# Altium footprint library WR-TBL_Rising Cage Clamp.PcbLib: 435 footprints (part 15 of 28)
Each footprint in its own frame and in the unit in brackets; x right, y up, seen from the top. Pads: shape width x height; smd on the part's side, far side on the other; paste and mask are expansions set on the pad; w line width, h text height; cw(c..) or ccw(c..) is an arc to the next point about the centre after c.
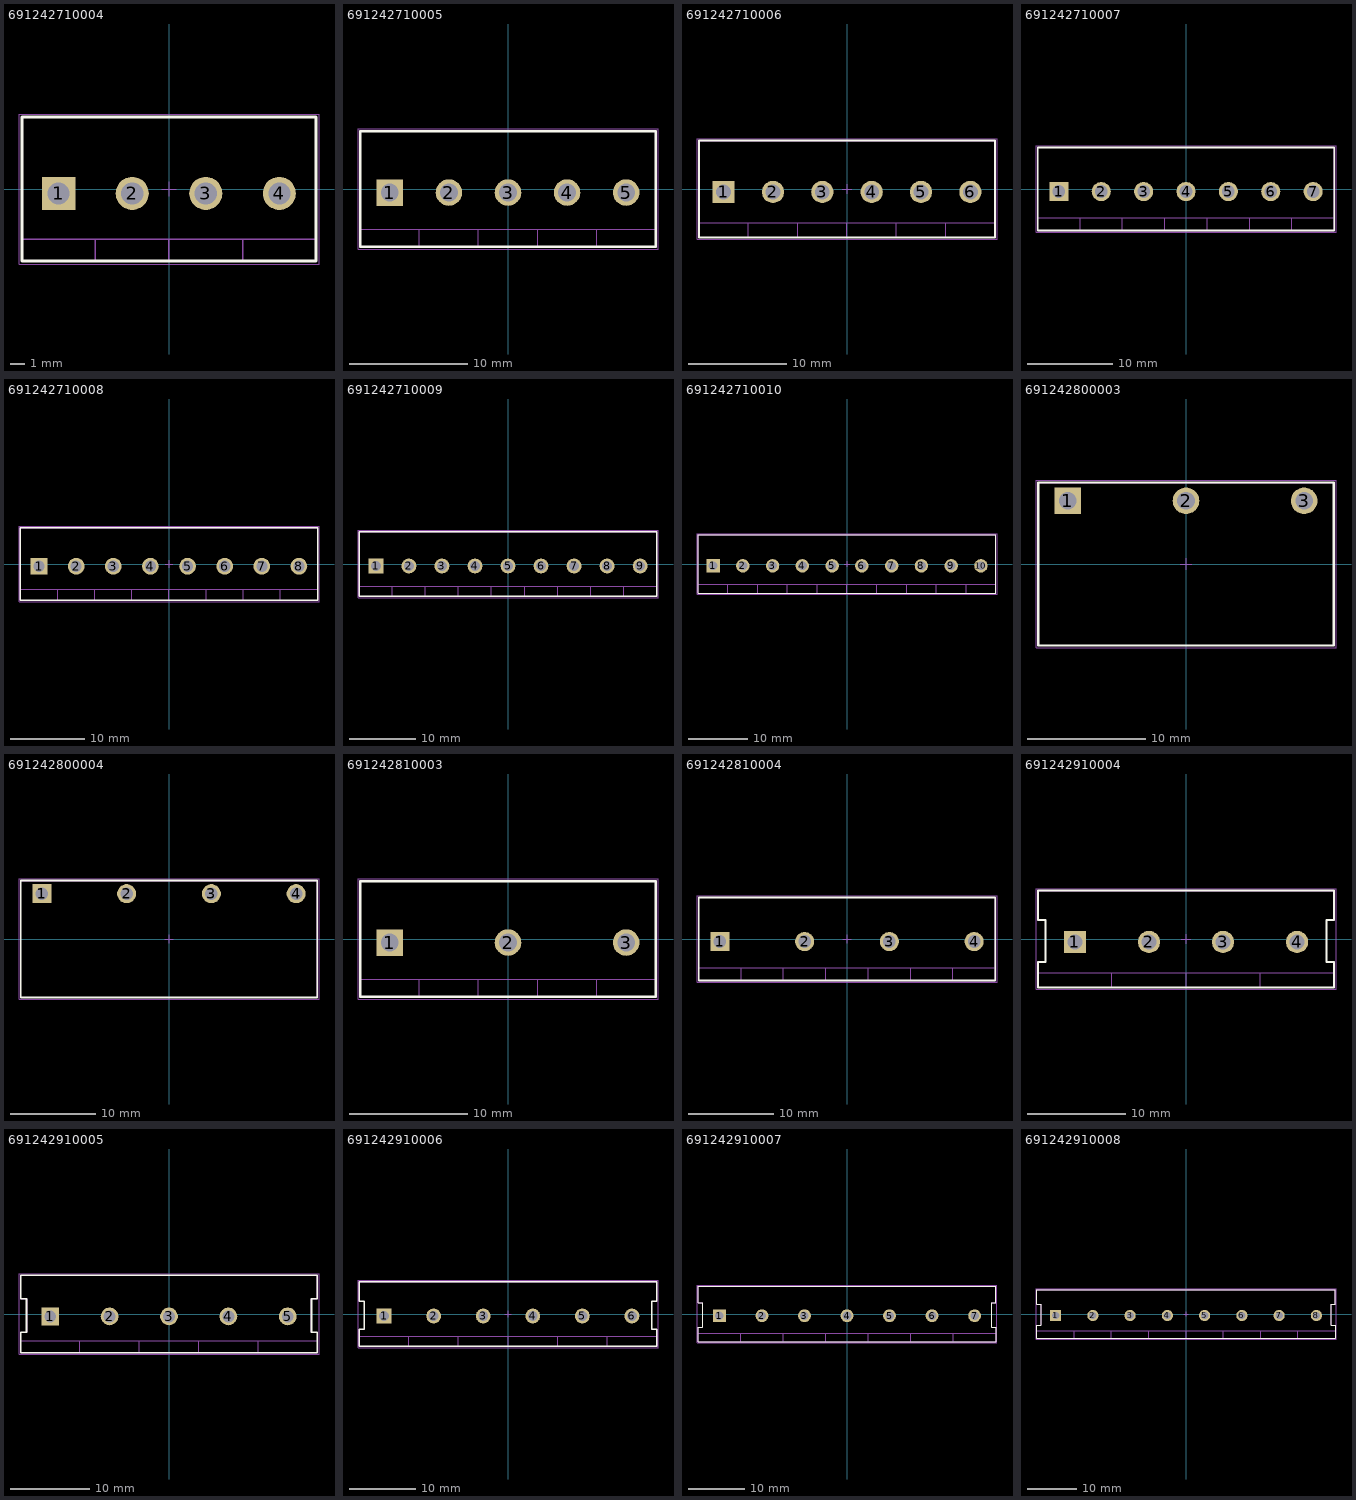
[diagram p14: the footprints below, top view; thin cyan lines are the x and y axes]

## 691242710004 [mm] "Serie 2427 - 5.00 mm_4 pins"
height 13.8
pads (4):
  rect 2.25x2.25 hole 1.5: 1(-7.5,-0.3)
  round 2.25 hole 1.5: 2(-2.5,-0.3) 3(2.5,-0.3) 4(7.5,-0.3)
Top Overlay:
  lines w0.2: -10,-4.9 -10,4.9 10,4.9 10,-4.9 -10,-4.9
Mechanical 13:
  lines w0.1: -10,-3.4 10,-3.4 ; -5,-4.9 -5,-3.4 ; 0,-4.9 0,-3.4 ; 5,-4.9 5,-3.4 ; -10,-4.9 10,-4.9 10,4.9 -10,4.9 -10,-4.9
Mechanical 15:
  lines w0.05: -0.5,0 0.5,0 ; 0,-0.5 0,0.5 ; -10.2,-5.1 -10.2,5.1 10.2,5.1 10.2,-5.1 -10.2,-5.1
3D body "691242710004.stp": height 13.85, standoff -3.45, extent -10,-4.9 10,4.9

## 691242710005 [mm] "Serie 2427 - 5.00 mm_5 pins"
height 13.8
pads (5):
  rect 2.25x2.25 hole 1.5: 1(-10,-0.3)
  round 2.25 hole 1.5: 2(-5,-0.3) 3(0,-0.3) 4(5,-0.3) 5(10,-0.3)
Top Overlay:
  lines w0.2: -12.5,-4.9 -12.5,4.9 12.5,4.9 12.5,-4.9 -12.5,-4.9
Mechanical 13:
  lines w0.1: -12.5,-3.4 12.5,-3.4 ; -7.5,-4.9 -7.5,-3.4 ; -2.5,-4.9 -2.5,-3.4 ; 2.5,-4.9 2.5,-3.4 ; 7.5,-4.9 7.5,-3.4 ; -12.5,-4.9 12.5,-4.9 12.5,4.9 -12.5,4.9 -12.5,-4.9
Mechanical 15:
  lines w0.05: -0.5,0 0.5,0 ; 0,-0.5 0,0.5 ; -12.7,-5.1 -12.7,5.1 12.7,5.1 12.7,-5.1 -12.7,-5.1
3D body "691242710005.stp": height 13.85, standoff -3.45, extent -12.5,-4.9 12.5,4.9

## 691242710006 [mm] "Serie 2427 - 5.00 mm_6 pins"
height 13.8
pads (6):
  rect 2.25x2.25 hole 1.5: 1(-12.5,-0.3)
  round 2.25 hole 1.5: 2(-7.5,-0.3) 3(-2.5,-0.3) 4(2.5,-0.3) 5(7.5,-0.3) 6(12.5,-0.3)
Top Overlay:
  lines w0.2: -15,-4.9 15,-4.9 15,4.9 -15,4.9 -15,-4.9
Mechanical 13:
  lines w0.1: -15,-3.4 15,-3.4 ; -10,-4.9 -10,-3.4 ; -5,-4.9 -5,-3.4 ; 0,-4.9 0,-3.4 ; 5,-4.9 5,-3.4 ; 10,-4.9 10,-3.4 ; -15,-4.9 -15,4.9 15,4.9 15,-4.9 -15,-4.9
Mechanical 15:
  lines w0.05: -0.5,0 0.5,0 ; 0,-0.5 0,0.5 ; -15.2,-5.1 15.2,-5.1 15.2,5.1 -15.2,5.1 -15.2,-5.1
3D body "691242710006.stp": height 13.85, standoff -3.45, extent -15,-4.9 15,4.9

## 691242710007 [mm] "Serie 2427 - 5.00 mm_7 pins"
height 13.8
pads (7):
  rect 2.25x2.25 hole 1.5: 1(-15,-0.3)
  round 2.25 hole 1.5: 2(-10,-0.3) 3(-5,-0.3) 4(0,-0.3) 5(5,-0.3) 6(10,-0.3) 7(15,-0.3)
Top Overlay:
  lines w0.2: -17.5,-4.9 17.5,-4.9 17.5,4.9 -17.5,4.9 -17.5,-4.9
Mechanical 13:
  lines w0.1: -17.5,-3.4 17.5,-3.4 ; -12.5,-4.9 -12.5,-3.4 ; -7.5,-4.9 -7.5,-3.4 ; -2.5,-4.9 -2.5,-3.4 ; 2.5,-4.9 2.5,-3.4 ; 7.5,-4.9 7.5,-3.4 ; 12.5,-4.9 12.5,-3.4 ; -17.5,-4.9 -17.5,4.9 17.5,4.9 17.5,-4.9 -17.5,-4.9
Mechanical 15:
  lines w0.05: -0.5,0 0.5,0 ; 0,-0.5 0,0.5 ; -17.7,-5.1 17.7,-5.1 17.7,5.1 -17.7,5.1 -17.7,-5.1
3D body "691242710007.stp": height 13.85, standoff -3.45, extent -17.5,-4.9 17.5,4.9

## 691242710008 [mm] "Serie 2427 - 5.00 mm_8 pins"
height 13.8
pads (8):
  rect 2.25x2.25 hole 1.5: 1(-17.5,-0.3)
  round 2.25 hole 1.5: 2(-12.5,-0.3) 3(-7.5,-0.3) 4(-2.5,-0.3) 5(2.5,-0.3) 6(7.5,-0.3) 7(12.5,-0.3) 8(17.5,-0.3)
Top Overlay:
  lines w0.2: -20,-4.9 20,-4.9 20,4.9 -20,4.9 -20,-4.9
Mechanical 13:
  lines w0.1: -20,-3.4 20,-3.4 ; -15,-4.9 -15,-3.4 ; -10,-4.9 -10,-3.4 ; -5,-4.9 -5,-3.4 ; 0,-4.9 0,-3.4 ; 5,-4.9 5,-3.4 ; 10,-4.9 10,-3.4 ; 15,-4.9 15,-3.4 ; -20,-4.9 -20,4.9 20,4.9 20,-4.9 -20,-4.9
Mechanical 15:
  lines w0.05: -0.5,0 0.5,0 ; 0,-0.5 0,0.5 ; -20.2,-5.1 20.2,-5.1 20.2,5.1 -20.2,5.1 -20.2,-5.1
3D body "691242710008.stp": height 13.85, standoff -3.45, extent -20,-4.9 20,4.9

## 691242710009 [mm] "Serie 2427 - 5.00 mm_9 pins"
height 13.8
pads (9):
  rect 2.25x2.25 hole 1.5: 1(-20,-0.3)
  round 2.25 hole 1.5: 2(-15,-0.3) 3(-10,-0.3) 4(-5,-0.3) 5(0,-0.3) 6(5,-0.3) 7(10,-0.3) 8(15,-0.3) 9(20,-0.3)
Top Overlay:
  lines w0.2: -22.5,-4.9 -22.5,4.9 22.5,4.9 22.5,-4.9 -22.5,-4.9
Mechanical 13:
  lines w0.1: -22.5,-3.4 22.5,-3.4 ; -17.5,-4.9 -17.5,-3.4 ; -12.5,-4.9 -12.5,-3.4 ; -7.5,-4.9 -7.5,-3.4 ; -2.5,-4.9 -2.5,-3.4 ; 2.5,-4.9 2.5,-3.4 ; 7.5,-4.9 7.5,-3.4 ; 12.5,-4.9 12.5,-3.4 ; 17.5,-4.9 17.5,-3.4 ; -22.5,-4.9 22.5,-4.9 22.5,4.9 -22.5,4.9 -22.5,-4.9
Mechanical 15:
  lines w0.05: -0.5,0 0.5,0 ; 0,-0.5 0,0.5 ; -22.7,-5.1 -22.7,5.1 22.7,5.1 22.7,-5.1 -22.7,-5.1
3D body "691242710009.stp": height 13.85, standoff -3.45, extent -22.5,-4.9 22.5,4.9

## 691242710010 [mm] "Serie 2427 - 5.00 mm_10 pins"
height 13.8
pads (10):
  rect 2.25x2.25 hole 1.5: 1(-22.5,-0.3)
  round 2.25 hole 1.5: 2(-17.5,-0.3) 3(-12.5,-0.3) 4(-7.5,-0.3) 5(-2.5,-0.3) 6(2.5,-0.3) 7(7.5,-0.3) 8(12.5,-0.3) 9(17.5,-0.3) 10(22.5,-0.3)
Top Overlay:
  lines w0.2: -25,-4.9 -25,4.9 25,4.9 25,-4.9 -25,-4.9
Mechanical 13:
  lines w0.1: -25,-3.4 25,-3.4 ; -20,-4.9 -20,-3.4 ; -15,-4.9 -15,-3.4 ; -10,-4.9 -10,-3.4 ; -5,-4.9 -5,-3.4 ; 0,-4.9 0,-3.4 ; 5,-4.9 5,-3.4 ; 10,-4.9 10,-3.4 ; 15,-4.9 15,-3.4 ; 20,-4.9 20,-3.4 ; -25,-4.9 25,-4.9 25,4.9 -25,4.9 -25,-4.9
Mechanical 15:
  lines w0.05: -0.5,0 0.5,0 ; 0,-0.5 0,0.5 ; -25.2,-5.1 -25.2,5.1 25.2,5.1 25.2,-5.1 -25.2,-5.1
3D body "691242710010.stp": height 13.85, standoff -3.45, extent -25,-4.9 25,4.9

## 691242800003 [mm] "Serie 2428-10.00mm Vertical Cable Entry with Rising Cage Clamp, 3 pins"
height 9
pads (3):
  rect 2.25x2.25 hole 1.5: 1(-10,5.35)
  round 2.25 hole 1.5: 2(0,5.35) 3(10,5.35)
Top Overlay:
  lines w0.2: -12.5,-6.9 12.5,-6.9 12.5,6.9 -12.5,6.9 -12.5,-6.9
Mechanical 13:
  lines w0.1: -12.5,-6.9 -12.5,6.9 12.5,6.9 12.5,-6.9 -12.5,-6.9
Mechanical 15:
  lines w0.05: -0.5,0 0.5,0 ; 0,-0.5 0,0.5 ; -12.7,-7.1 12.7,-7.1 12.7,7.1 -12.7,7.1 -12.7,-7.1
3D body "691242800003.stp": height 10, standoff -3.3, extent -12.5,-6.9 12.5,6.9

## 691242800004 [mm] "Serie 2428-10.00mm Vertical Cable Entry with Rising Cage Clamp, 4 pins"
height 9
pads (4):
  rect 2.25x2.25 hole 1.5: 1(-15,5.35)
  round 2.25 hole 1.5: 2(-5,5.35) 3(5,5.35) 4(15,5.35)
Top Overlay:
  lines w0.2: -17.5,-6.9 17.5,-6.9 17.5,6.9 -17.5,6.9 -17.5,-6.9
Mechanical 13:
  lines w0.1: -17.5,-6.9 -17.5,6.9 17.5,6.9 17.5,-6.9 -17.5,-6.9
Mechanical 15:
  lines w0.05: -0.5,0 0.5,0 ; 0,-0.5 0,0.5 ; -17.7,-7.1 17.7,-7.1 17.7,7.1 -17.7,7.1 -17.7,-7.1
3D body "691242800004.stp": height 10, standoff -3.3, extent -17.5,-6.9 17.5,6.9

## 691242810003 [mm] "Serie 2428 - 10.00 mm _ 3 pins"
height 13.8
pads (3):
  rect 2.25x2.25 hole 1.5: 1(-10,-0.3)
  round 2.25 hole 1.5: 2(0,-0.3) 3(10,-0.3)
Top Overlay:
  lines w0.2: -12.5,-4.9 12.5,-4.9 12.5,4.9 -12.5,4.9 -12.5,-4.9
Mechanical 13:
  lines w0.1: -12.5,-3.4 12.5,-3.4 ; -7.5,-4.9 -7.5,-3.4 ; -2.5,-4.9 -2.5,-3.4 ; 2.5,-4.9 2.5,-3.4 ; 7.5,-4.9 7.5,-3.4 ; -12.5,-4.9 -12.5,4.9 12.5,4.9 12.5,-4.9 -12.5,-4.9
Mechanical 15:
  lines w0.05: -0.5,0 0.5,0 ; 0,-0.5 0,0.5 ; -12.7,-5.1 12.7,-5.1 12.7,5.1 -12.7,5.1 -12.7,-5.1
3D body "691242810003.stp": height 13.9, standoff -3.4, extent -12.5,-4.9 12.5,4.9

## 691242810004 [mm] "Serie 2428 - 10.00 mm _ 4 pins"
height 13.8
pads (4):
  rect 2.25x2.25 hole 1.5: 1(-15,-0.3)
  round 2.25 hole 1.5: 2(-5,-0.3) 3(5,-0.3) 4(15,-0.3)
Top Overlay:
  lines w0.2: -17.5,-4.9 17.5,-4.9 17.5,4.9 -17.5,4.9 -17.5,-4.9
Mechanical 13:
  lines w0.1: -17.5,-3.4 17.5,-3.4 ; -12.5,-4.9 -12.5,-3.4 ; -7.5,-4.9 -7.5,-3.4 ; -2.5,-4.9 -2.5,-3.4 ; 2.5,-4.9 2.5,-3.4 ; 7.5,-4.9 7.5,-3.4 ; 12.5,-4.9 12.5,-3.4 ; -17.5,-4.9 -17.5,4.9 17.5,4.9 17.5,-4.9 -17.5,-4.9
Mechanical 15:
  lines w0.05: -0.5,0 0.5,0 ; 0,-0.5 0,0.5 ; -17.7,-5.1 17.7,-5.1 17.7,5.1 -17.7,5.1 -17.7,-5.1
3D body "691242810004.stp": height 13.9, standoff -3.4, extent -17.5,-4.9 17.5,4.9

## 691242910004 [mm] "Serie 2429 -7.50 mm_4 pins"
height 13.8
pads (4):
  rect 2.25x2.25 hole 1.5: 1(-11.25,-0.3)
  round 2.25 hole 1.5: 2(-3.75,-0.3) 3(3.75,-0.3) 4(11.25,-0.3)
Top Overlay:
  lines w0.2: -15,-4.9 15,-4.9 15,-2.31 14.25,-2.31 14.25,1.94 15,1.94 15,4.9 -15,4.9 -15,1.94 -14.25,1.94 -14.25,-2.31 -15,-2.31 -15,-4.9
Mechanical 13:
  lines w0.1: -15,-3.4 15,-3.4 ; -7.5,-4.9 -7.5,-3.4 ; 0,-4.9 0,-3.4 ; 7.5,-4.9 7.5,-3.4 ; -15,-4.9 -15,-2.31 -14.25,-2.31 -14.25,1.94 -15,1.94 -15,4.9 15,4.9 15,1.94 14.25,1.94 14.25,-2.31 15,-2.31 15,-4.9 -15,-4.9
Mechanical 15:
  lines w0.05: -0.5,0 0.5,0 ; 0,-0.5 0,0.5 ; -15.2,-5.1 -15.2,5.1 15.2,5.1 15.2,-5.1 -15.2,-5.1
3D body "691242910004.stp": height 13.9, standoff -3.4, extent -15,-4.9 15,4.9

## 691242910005 [mm] "Serie 2429 -7.50 mm_5 pins"
height 13.8
pads (5):
  rect 2.25x2.25 hole 1.5: 1(-15,-0.3)
  round 2.25 hole 1.5: 2(-7.5,-0.3) 3(0,-0.3) 4(7.5,-0.3) 5(15,-0.3)
Top Overlay:
  lines w0.2: -18.75,-4.9 -18.75,-2.31 -18,-2.31 -18,1.94 -18.75,1.94 -18.75,4.9 18.75,4.9 18.75,1.94 18,1.94 18,-2.31 18.75,-2.31 18.75,-4.9 -18.75,-4.9
Mechanical 13:
  lines w0.1: -18.75,-3.4 18.75,-3.4 ; -11.25,-4.9 -11.25,-3.4 ; -3.75,-4.9 -3.75,-3.4 ; 3.75,-4.9 3.75,-3.4 ; 11.25,-4.9 11.25,-3.4 ; -18.75,-4.9 18.75,-4.9 18.75,-2.31 18,-2.31 18,1.94 18.75,1.94 18.75,4.9 -18.75,4.9 -18.75,1.94 -18,1.94 -18,-2.31 -18.75,-2.31 -18.75,-4.9
Mechanical 15:
  lines w0.05: -0.5,0 0.5,0 ; 0,-0.5 0,0.5 ; -18.95,-5.1 18.95,-5.1 18.95,5.1 -18.95,5.1 -18.95,-5.1
3D body "691242910005.stp": height 13.9, standoff -3.4, extent -18.75,-4.9 18.75,4.9

## 691242910006 [mm] "Serie 2429 -7.50 mm_6 pins"
height 13.8
pads (6):
  rect 2.25x2.25 hole 1.5: 1(-18.75,-0.3)
  round 2.25 hole 1.5: 2(-11.25,-0.3) 3(-3.75,-0.3) 4(3.75,-0.3) 5(11.25,-0.3) 6(18.75,-0.3)
Top Overlay:
  lines w0.2: -22.5,-4.9 22.5,-4.9 22.5,-2.31 21.75,-2.31 21.75,1.94 22.5,1.94 22.5,4.9 -22.5,4.9 -22.5,1.94 -21.75,1.94 -21.75,-2.31 -22.5,-2.31 -22.5,-4.9
Mechanical 13:
  lines w0.1: -22.5,-3.4 22.5,-3.4 ; -15,-4.9 -15,-3.4 ; -7.5,-4.9 -7.5,-3.4 ; 0,-4.9 0,-3.4 ; 7.5,-4.9 7.5,-3.4 ; 15,-4.9 15,-3.4 ; -22.5,-4.9 -22.5,-2.31 -21.75,-2.31 -21.75,1.94 -22.5,1.94 -22.5,4.9 22.5,4.9 22.5,1.94 21.75,1.94 21.75,-2.31 22.5,-2.31 22.5,-4.9 -22.5,-4.9
Mechanical 15:
  lines w0.05: -0.5,0 0.5,0 ; 0,-0.5 0,0.5 ; -22.7,-5.1 -22.7,5.1 22.7,5.1 22.7,-5.1 -22.7,-5.1
3D body "691242910006.stp": height 13.9, standoff -3.4, extent -22.5,-4.9 22.5,4.9

## 691242910007 [mm] "Serie 2429 -7.50 mm_7 pins"
height 13.8
pads (7):
  rect 2.25x2.25 hole 1.5: 1(-22.5,-0.3)
  round 2.25 hole 1.5: 2(-15,-0.3) 3(-7.5,-0.3) 4(0,-0.3) 5(7.5,-0.3) 6(15,-0.3) 7(22.5,-0.3)
Top Overlay:
  lines w0.2: -26.25,-4.9 -26.25,-2.31 -25.5,-2.31 -25.5,1.94 -26.25,1.94 -26.25,4.9 26.25,4.9 26.25,1.94 25.5,1.94 25.5,-2.31 26.25,-2.31 26.25,-4.9 -26.25,-4.9
Mechanical 13:
  lines w0.1: -26.25,-3.4 26.25,-3.4 ; -18.75,-4.9 -18.75,-3.4 ; -11.25,-4.9 -11.25,-3.4 ; -3.75,-4.9 -3.75,-3.4 ; 3.75,-4.9 3.75,-3.4 ; 11.25,-4.9 11.25,-3.4 ; 18.75,-4.9 18.75,-3.4 ; -26.25,-4.9 26.25,-4.9 26.25,-2.31 25.5,-2.31 25.5,1.94 26.25,1.94 26.25,4.9 -26.25,4.9 -26.25,1.94 -25.5,1.94 -25.5,-2.31 -26.25,-2.31 -26.25,-4.9
Mechanical 15:
  lines w0.05: -0.5,0 0.5,0 ; 0,-0.5 0,0.5 ; -26.45,-5.1 26.45,-5.1 26.45,5.1 -26.45,5.1 -26.45,-5.1
3D body "691242910007.stp": height 13.9, standoff -3.4, extent -26.25,-4.9 26.25,4.9

## 691242910008 [mm] "Serie 2429 -7.50 mm_8 pins"
height 13.8
pads (8):
  rect 2.25x2.25 hole 1.5: 1(-26.25,-0.3)
  round 2.25 hole 1.5: 2(-18.75,-0.3) 3(-11.25,-0.3) 4(-3.75,-0.3) 5(3.75,-0.3) 6(11.25,-0.3) 7(18.75,-0.3) 8(26.25,-0.3)
Top Overlay:
  lines w0.2: -30,-4.9 30,-4.9 30,-2.31 29.25,-2.31 29.25,1.94 30,1.94 30,4.9 -30,4.9 -30,1.94 -29.25,1.94 -29.25,-2.31 -30,-2.31 -30,-4.9
Mechanical 13:
  lines w0.1: -30,-3.4 30,-3.4 ; -22.5,-4.9 -22.5,-3.4 ; -15,-4.9 -15,-3.4 ; -7.5,-4.9 -7.5,-3.4 ; 0,-4.9 0,-3.4 ; 7.5,-4.9 7.5,-3.4 ; 15,-4.9 15,-3.4 ; 22.5,-4.9 22.5,-3.4 ; -30,-4.9 -30,-2.31 -29.25,-2.31 -29.25,1.94 -30,1.94 -30,4.9 30,4.9 30,1.94 29.25,1.94 29.25,-2.31 30,-2.31 30,-4.9 -30,-4.9
Mechanical 15:
  lines w0.05: -0.5,0 0.5,0 ; 0,-0.5 0,0.5 ; -30.2,-5.1 -30.2,5.1 30.2,5.1 30.2,-5.1 -30.2,-5.1
3D body "691242910008.stp": height 13.9, standoff -3.4, extent -30,-4.9 30,4.9